# Altium footprint library con-molex.PCBLIB: 368 footprints (part 11 of 26) (continued)
## 52760-1679 [mm] (continued)
  round 0.7 hole 0.7: 1(26.735,0)
  rect 2.5x2 smd: M1(-28.775,0) M2(28.775,0)
Top Overlay:
  lines w0.203: -28.65,-1.5 -29.25,-1.5 -29.25,-1.9 -28.05,-3.1 -27.25,-3.1 -27.25,-2.4 ; -28.65,1.5 -29.25,1.5 -29.25,3.1 -27.25,3.1 -27.25,2.4 ; -25.65,-2 -27.4,-2 -27.4,0 -26.65,0 -26.65,2 -25.65,2 ; -25.65,-1 cw(c-25.65,-0.75) -25.9,-0.75 -25.9,0.75 cw(c-25.65,0.75) -25.65,1 ; 25.65,-2 27.4,-2 27.4,0 26.65,0 26.65,2 25.65,2 ; 25.65,-1 ccw(c25.65,-0.75) 25.9,-0.75 25.9,0.75 ccw(c25.65,0.75) 25.65,1 ; 27.25,-2.4 27.25,-3.1 29.25,-3.1 29.25,-1.5 28.65,-1.5 ; 27.25,2.4 27.25,3.1 29.25,3.1 29.25,1.5 28.65,1.5
Top Solder:
  drawing of 160 lines, arcs and shapes, not listed
Mechanical 16:
  drawing of 168 lines, arcs and shapes, not listed

## 52760-1879 [mm]
pads (184):
  round 0.9 hole 0.9: 1(-29.91,0)
  rect 0.35x2.5 smd: 1(-28.258,-2.35) 2(-28.258,2.35) 3(-27.622,-2.35) 4(-27.622,2.35) 5(-26.987,-2.35) 6(-26.987,2.35) 7(-26.352,-2.35) 8(-26.352,2.35) 9(-25.717,-2.35) 10(-25.717,2.35) 11(-25.082,-2.35) 12(-25.082,2.35) 13(-24.447,-2.35) 14(-24.447,2.35) 15(-23.812,-2.35) 16(-23.812,2.35) 17(-23.177,-2.35) 18(-23.177,2.35) 19(-22.543,-2.35) 20(-22.543,2.35) 21(-21.907,-2.35) 22(-21.907,2.35) 23(-21.273,-2.35) 24(-21.273,2.35) 25(-20.637,-2.35) 26(-20.637,2.35) 27(-20.002,-2.35) 28(-20.002,2.35) 29(-19.367,-2.35) 30(-19.367,2.35) 31(-18.732,-2.35) 32(-18.732,2.35) 33(-18.098,-2.35) 34(-18.098,2.35) 35(-17.462,-2.35) 36(-17.462,2.35) 37(-16.828,-2.35) 38(-16.828,2.35) 39(-16.192,-2.35) 40(-16.192,2.35) 41(-15.557,-2.35) 42(-15.557,2.35) 43(-14.922,-2.35) 44(-14.922,2.35) 45(-14.287,-2.35) 46(-14.287,2.35) 47(-13.652,-2.35) 48(-13.652,2.35) 49(-13.018,-2.35) 50(-13.018,2.35) 51(-12.383,-2.35) 52(-12.383,2.35) 53(-11.747,-2.35) 54(-11.747,2.35) 55(-11.112,-2.35) 56(-11.112,2.35) 57(-10.477,-2.35) 58(-10.477,2.35) 59(-9.842,-2.35) 60(-9.842,2.35) 61(-9.207,-2.35) 62(-9.207,2.35) 63(-8.572,-2.35) 64(-8.572,2.35) 65(-7.938,-2.35) 66(-7.938,2.35) 67(-7.302,-2.35) 68(-7.302,2.35) 69(-6.667,-2.35) 70(-6.667,2.35) 71(-6.032,-2.35) 72(-6.032,2.35) 73(-5.397,-2.35) 74(-5.397,2.35) 75(-4.763,-2.35) 76(-4.763,2.35) 77(-4.127,-2.35) 78(-4.127,2.35) 79(-3.492,-2.35) 80(-3.492,2.35) 81(-2.857,-2.35) 82(-2.857,2.35) 83(-2.222,-2.35) 84(-2.222,2.35) 85(-1.587,-2.35) 86(-1.587,2.35) 87(-0.953,-2.35) 88(-0.953,2.35) 89(-0.318,-2.35) 90(-0.318,2.35) 91(0.318,-2.35) 92(0.318,2.35) 93(0.953,-2.35) 94(0.953,2.35) 95(1.587,-2.35) 96(1.587,2.35) 97(2.222,-2.35) 98(2.222,2.35) 99(2.857,-2.35) 100(2.857,2.35) 101(3.492,-2.35) 102(3.492,2.35) 103(4.127,-2.35) 104(4.127,2.35) 105(4.763,-2.35) 106(4.763,2.35) 107(5.397,-2.35) 108(5.397,2.35) 109(6.032,-2.35) 110(6.032,2.35) 111(6.667,-2.35) 112(6.667,2.35) 113(7.302,-2.35) 114(7.302,2.35) 115(7.938,-2.35) 116(7.938,2.35) 117(8.572,-2.35) 118(8.572,2.35) 119(9.207,-2.35) 120(9.207,2.35) 121(9.842,-2.35) 122(9.842,2.35) 123(10.477,-2.35) 124(10.477,2.35) 125(11.112,-2.35) 126(11.112,2.35) 127(11.747,-2.35) 128(11.747,2.35) 129(12.383,-2.35) 130(12.383,2.35) 131(13.018,-2.35) 132(13.018,2.35) 133(13.652,-2.35) 134(13.652,2.35) 135(14.287,-2.35) 136(14.287,2.35) 137(14.922,-2.35) 138(14.922,2.35) 139(15.557,-2.35) 140(15.557,2.35) 141(16.192,-2.35) 142(16.192,2.35) 143(16.828,-2.35) 144(16.828,2.35) 145(17.462,-2.35) 146(17.462,2.35) 147(18.098,-2.35) 148(18.098,2.35) 149(18.732,-2.35) 150(18.732,2.35) 151(19.367,-2.35) 152(19.367,2.35) 153(20.002,-2.35) 154(20.002,2.35) 155(20.637,-2.35) 156(20.637,2.35) 157(21.273,-2.35) 158(21.273,2.35) 159(21.907,-2.35) 160(21.907,2.35) 161(22.543,-2.35) 162(22.543,2.35) 163(23.177,-2.35) 164(23.177,2.35) 165(23.812,-2.35) 166(23.812,2.35) 167(24.447,-2.35) 168(24.447,2.35) 169(25.082,-2.35) 170(25.082,2.35) 171(25.717,-2.35) 172(25.717,2.35) 173(26.352,-2.35) 174(26.352,2.35) 175(26.987,-2.35) 176(26.987,2.35) 177(27.622,-2.35) 178(27.622,2.35) 179(28.258,-2.35) 180(28.258,2.35)
  round 0.7 hole 0.7: 1(29.91,0)
  rect 2.5x2 smd: M1(-31.95,0) M2(31.95,0)
Top Overlay:
  lines w0.203: -31.825,-1.5 -32.425,-1.5 -32.425,-1.9 -31.225,-3.1 -30.425,-3.1 -30.425,-2.4 ; -31.825,1.5 -32.425,1.5 -32.425,3.1 -30.425,3.1 -30.425,2.4 ; -28.825,-2 -30.575,-2 -30.575,0 -29.825,0 -29.825,2 -28.825,2 ; -28.825,-1 cw(c-28.825,-0.75) -29.075,-0.75 -29.075,0.75 cw(c-28.825,0.75) -28.825,1 ; 28.825,-2 30.575,-2 30.575,0 29.825,0 29.825,2 28.825,2 ; 28.825,-1 ccw(c28.825,-0.75) 29.075,-0.75 29.075,0.75 ccw(c28.825,0.75) 28.825,1 ; 30.425,-2.4 30.425,-3.1 32.425,-3.1 32.425,-1.5 31.825,-1.5 ; 30.425,2.4 30.425,3.1 32.425,3.1 32.425,1.5 31.825,1.5
Top Solder:
  drawing of 180 lines, arcs and shapes, not listed
Mechanical 16:
  drawing of 188 lines, arcs and shapes, not listed

## 52760-2079 [mm]
pads (204):
  round 0.9 hole 0.9: 1(-33.085,0)
  rect 0.35x2.5 smd: 1(-31.432,-2.35) 2(-31.432,2.35) 3(-30.797,-2.35) 4(-30.797,2.35) 5(-30.162,-2.35) 6(-30.162,2.35) 7(-29.527,-2.35) 8(-29.527,2.35) 9(-28.892,-2.35) 10(-28.892,2.35) 11(-28.258,-2.35) 12(-28.258,2.35) 13(-27.622,-2.35) 14(-27.622,2.35) 15(-26.987,-2.35) 16(-26.987,2.35) 17(-26.352,-2.35) 18(-26.352,2.35) 19(-25.717,-2.35) 20(-25.717,2.35) 21(-25.082,-2.35) 22(-25.082,2.35) 23(-24.447,-2.35) 24(-24.447,2.35) 25(-23.812,-2.35) 26(-23.812,2.35) 27(-23.177,-2.35) 28(-23.177,2.35) 29(-22.543,-2.35) 30(-22.543,2.35) 31(-21.907,-2.35) 32(-21.907,2.35) 33(-21.273,-2.35) 34(-21.273,2.35) 35(-20.637,-2.35) 36(-20.637,2.35) 37(-20.002,-2.35) 38(-20.002,2.35) 39(-19.367,-2.35) 40(-19.367,2.35) 41(-18.732,-2.35) 42(-18.732,2.35) 43(-18.098,-2.35) 44(-18.098,2.35) 45(-17.462,-2.35) 46(-17.462,2.35) 47(-16.828,-2.35) 48(-16.828,2.35) 49(-16.192,-2.35) 50(-16.192,2.35) 51(-15.557,-2.35) 52(-15.557,2.35) 53(-14.922,-2.35) 54(-14.922,2.35) 55(-14.287,-2.35) 56(-14.287,2.35) 57(-13.652,-2.35) 58(-13.652,2.35) 59(-13.018,-2.35) 60(-13.018,2.35) 61(-12.383,-2.35) 62(-12.383,2.35) 63(-11.747,-2.35) 64(-11.747,2.35) 65(-11.112,-2.35) 66(-11.112,2.35) 67(-10.477,-2.35) 68(-10.477,2.35) 69(-9.842,-2.35) 70(-9.842,2.35) 71(-9.207,-2.35) 72(-9.207,2.35) 73(-8.572,-2.35) 74(-8.572,2.35) 75(-7.938,-2.35) 76(-7.938,2.35) 77(-7.302,-2.35) 78(-7.302,2.35) 79(-6.667,-2.35) 80(-6.667,2.35) 81(-6.032,-2.35) 82(-6.032,2.35) 83(-5.397,-2.35) 84(-5.397,2.35) 85(-4.763,-2.35) 86(-4.763,2.35) 87(-4.127,-2.35) 88(-4.127,2.35) 89(-3.492,-2.35) 90(-3.492,2.35) 91(-2.857,-2.35) 92(-2.857,2.35) 93(-2.222,-2.35) 94(-2.222,2.35) 95(-1.587,-2.35) 96(-1.587,2.35) 97(-0.953,-2.35) 98(-0.953,2.35) 99(-0.318,-2.35) 100(-0.318,2.35) 101(0.318,-2.35) 102(0.318,2.35) 103(0.953,-2.35) 104(0.953,2.35) 105(1.587,-2.35) 106(1.587,2.35) 107(2.222,-2.35) 108(2.222,2.35) 109(2.857,-2.35) 110(2.857,2.35) 111(3.492,-2.35) 112(3.492,2.35) 113(4.127,-2.35) 114(4.127,2.35) 115(4.763,-2.35) 116(4.763,2.35) 117(5.397,-2.35) 118(5.397,2.35) 119(6.032,-2.35) 120(6.032,2.35) 121(6.667,-2.35) 122(6.667,2.35) 123(7.302,-2.35) 124(7.302,2.35) 125(7.938,-2.35) 126(7.938,2.35) 127(8.572,-2.35) 128(8.572,2.35) 129(9.207,-2.35) 130(9.207,2.35) 131(9.842,-2.35) 132(9.842,2.35) 133(10.477,-2.35) 134(10.477,2.35) 135(11.112,-2.35) 136(11.112,2.35) 137(11.747,-2.35) 138(11.747,2.35) 139(12.383,-2.35) 140(12.383,2.35) 141(13.018,-2.35) 142(13.018,2.35) 143(13.652,-2.35) 144(13.652,2.35) 145(14.287,-2.35) 146(14.287,2.35) 147(14.922,-2.35) 148(14.922,2.35) 149(15.557,-2.35) 150(15.557,2.35) 151(16.192,-2.35) 152(16.192,2.35) 153(16.828,-2.35) 154(16.828,2.35) 155(17.462,-2.35) 156(17.462,2.35) 157(18.098,-2.35) 158(18.098,2.35) 159(18.732,-2.35) 160(18.732,2.35) 161(19.367,-2.35) 162(19.367,2.35) 163(20.002,-2.35) 164(20.002,2.35) 165(20.637,-2.35) 166(20.637,2.35) 167(21.273,-2.35) 168(21.273,2.35) 169(21.907,-2.35) 170(21.907,2.35) 171(22.543,-2.35) 172(22.543,2.35) 173(23.177,-2.35) 174(23.177,2.35) 175(23.812,-2.35) 176(23.812,2.35) 177(24.447,-2.35) 178(24.447,2.35) 179(25.082,-2.35) 180(25.082,2.35) 181(25.717,-2.35) 182(25.717,2.35) 183(26.352,-2.35) 184(26.352,2.35) 185(26.987,-2.35) 186(26.987,2.35) 187(27.622,-2.35) 188(27.622,2.35) 189(28.258,-2.35) 190(28.258,2.35) 191(28.892,-2.35) 192(28.892,2.35) 193(29.527,-2.35) 194(29.527,2.35) 195(30.162,-2.35) 196(30.162,2.35) 197(30.797,-2.35) 198(30.797,2.35) 199(31.432,-2.35) 200(31.432,2.35)
  round 0.7 hole 0.7: 1(33.085,0)
  rect 2.5x2 smd: M1(-35.125,0) M2(35.125,0)
Top Overlay:
  lines w0.203: -35,-1.5 -35.6,-1.5 -35.6,-1.9 -34.4,-3.1 -33.6,-3.1 -33.6,-2.4 ; -35,1.5 -35.6,1.5 -35.6,3.1 -33.6,3.1 -33.6,2.4 ; -32,-2 -33.75,-2 -33.75,0 -33,0 -33,2 -32,2 ; -32,-1 cw(c-32,-0.75) -32.25,-0.75 -32.25,0.75 cw(c-32,0.75) -32,1 ; 32,-2 33.75,-2 33.75,0 33,0 33,2 32,2 ; 32,-1 ccw(c32,-0.75) 32.25,-0.75 32.25,0.75 ccw(c32,0.75) 32,1 ; 33.6,-2.4 33.6,-3.1 35.6,-3.1 35.6,-1.5 35,-1.5 ; 33.6,2.4 33.6,3.1 35.6,3.1 35.6,1.5 35,1.5
Top Solder:
  drawing of 200 lines, arcs and shapes, not listed
Mechanical 16:
  drawing of 208 lines, arcs and shapes, not listed

## 52760-6879 [mm]
pads (72):
  round 0.9 hole 0.9: 1(-12.13,0)
  rect 0.35x2.5 smd: 1(-10.477,-2.35) 2(-10.477,2.35) 3(-9.842,-2.35) 4(-9.842,2.35) 5(-9.207,-2.35) 6(-9.207,2.35) 7(-8.572,-2.35) 8(-8.572,2.35) 9(-7.938,-2.35) 10(-7.938,2.35) 11(-7.302,-2.35) 12(-7.302,2.35) 13(-6.667,-2.35) 14(-6.667,2.35) 15(-6.032,-2.35) 16(-6.032,2.35) 17(-5.397,-2.35) 18(-5.397,2.35) 19(-4.763,-2.35) 20(-4.763,2.35) 21(-4.127,-2.35) 22(-4.127,2.35) 23(-3.492,-2.35) 24(-3.492,2.35) 25(-2.857,-2.35) 26(-2.857,2.35) 27(-2.222,-2.35) 28(-2.222,2.35) 29(-1.587,-2.35) 30(-1.587,2.35) 31(-0.953,-2.35) 32(-0.953,2.35) 33(-0.318,-2.35) 34(-0.318,2.35) 35(0.318,-2.35) 36(0.318,2.35) 37(0.953,-2.35) 38(0.953,2.35) 39(1.587,-2.35) 40(1.587,2.35) 41(2.222,-2.35) 42(2.222,2.35) 43(2.857,-2.35) 44(2.857,2.35) 45(3.492,-2.35) 46(3.492,2.35) 47(4.127,-2.35) 48(4.127,2.35) 49(4.763,-2.35) 50(4.763,2.35) 51(5.397,-2.35) 52(5.397,2.35) 53(6.032,-2.35) 54(6.032,2.35) 55(6.667,-2.35) 56(6.667,2.35) 57(7.302,-2.35) 58(7.302,2.35) 59(7.938,-2.35) 60(7.938,2.35) 61(8.572,-2.35) 62(8.572,2.35) 63(9.207,-2.35) 64(9.207,2.35) 65(9.842,-2.35) 66(9.842,2.35) 67(10.477,-2.35) 68(10.477,2.35)
  round 0.7 hole 0.7: 1(12.13,0)
  rect 2.5x2 smd: M1(-14.17,0) M2(14.17,0)
Top Overlay:
  lines w0.203: -14.045,-1.5 -14.645,-1.5 -14.645,-1.9 -13.445,-3.1 -12.645,-3.1 -12.645,-2.4 ; -14.045,1.5 -14.645,1.5 -14.645,3.1 -12.645,3.1 -12.645,2.4 ; -11.045,-2 -12.795,-2 -12.795,0 -12.045,0 -12.045,2 -11.045,2 ; -11.045,-1 cw(c-11.045,-0.75) -11.295,-0.75 -11.295,0.75 cw(c-11.045,0.75) -11.045,1 ; 11.045,-2 12.795,-2 12.795,0 12.045,0 12.045,2 11.045,2 ; 11.045,-1 ccw(c11.045,-0.75) 11.295,-0.75 11.295,0.75 ccw(c11.045,0.75) 11.045,1 ; 12.645,-2.4 12.645,-3.1 14.645,-3.1 14.645,-1.5 14.045,-1.5 ; 12.645,2.4 12.645,3.1 14.645,3.1 14.645,1.5 14.045,1.5
Top Solder:
  rectangle: -10.677,-3.625 -10.278,-1.075
  region: -10.278,3.625 -10.677,3.625 -10.677,1.075 -10.278,1.075
  rectangle: -10.042,-3.625 -9.643,-1.075
  region: -9.643,3.625 -10.042,3.625 -10.042,1.075 -9.643,1.075
  rectangle: -9.407,-3.625 -9.008,-1.075
  region: -9.008,3.625 -9.407,3.625 -9.407,1.075 -9.008,1.075
  rectangle: -8.772,-3.625 -8.373,-1.075
  region: -8.373,3.625 -8.772,3.625 -8.772,1.075 -8.373,1.075
  rectangle: -8.137,-3.625 -7.738,-1.075
  region: -7.738,3.625 -8.137,3.625 -8.137,1.075 -7.738,1.075
  rectangle: -7.502,-3.625 -7.103,-1.075
  region: -7.103,3.625 -7.502,3.625 -7.502,1.075 -7.103,1.075
  rectangle: -6.867,-3.625 -6.468,-1.075
  region: -6.468,3.625 -6.867,3.625 -6.867,1.075 -6.468,1.075
  rectangle: -6.232,-3.625 -5.833,-1.075
  region: -5.833,3.625 -6.232,3.625 -6.232,1.075 -5.833,1.075
  rectangle: -5.597,-3.625 -5.198,-1.075
  region: -5.198,3.625 -5.597,3.625 -5.597,1.075 -5.198,1.075
  rectangle: -4.962,-3.625 -4.563,-1.075
  region: -4.563,3.625 -4.962,3.625 -4.962,1.075 -4.563,1.075
  rectangle: -4.327,-3.625 -3.928,-1.075
  region: -3.928,3.625 -4.327,3.625 -4.327,1.075 -3.928,1.075
  rectangle: -3.692,-3.625 -3.293,-1.075
  region: -3.293,3.625 -3.692,3.625 -3.692,1.075 -3.293,1.075
  rectangle: -3.057,-3.625 -2.658,-1.075
  region: -2.658,3.625 -3.057,3.625 -3.057,1.075 -2.658,1.075
  rectangle: -2.422,-3.625 -2.023,-1.075
  region: -2.023,3.625 -2.422,3.625 -2.422,1.075 -2.023,1.075
  rectangle: -1.787,-3.625 -1.388,-1.075
  region: -1.388,3.625 -1.787,3.625 -1.787,1.075 -1.388,1.075
  rectangle: -1.152,-3.625 -0.753,-1.075
  region: -0.753,3.625 -1.152,3.625 -1.152,1.075 -0.753,1.075
  rectangle: -0.517,-3.625 -0.118,-1.075
  region: -0.118,3.625 -0.517,3.625 -0.517,1.075 -0.118,1.075
  rectangle: 0.118,-3.625 0.517,-1.075
  region: 0.517,3.625 0.118,3.625 0.118,1.075 0.517,1.075
  rectangle: 0.753,-3.625 1.152,-1.075
  region: 1.152,3.625 0.753,3.625 0.753,1.075 1.152,1.075
  rectangle: 1.388,-3.625 1.787,-1.075
  region: 1.787,3.625 1.388,3.625 1.388,1.075 1.787,1.075
  rectangle: 2.023,-3.625 2.422,-1.075
  region: 2.422,3.625 2.023,3.625 2.023,1.075 2.422,1.075
  rectangle: 2.658,-3.625 3.057,-1.075
  region: 3.057,3.625 2.658,3.625 2.658,1.075 3.057,1.075
  rectangle: 3.293,-3.625 3.692,-1.075
  region: 3.692,3.625 3.293,3.625 3.293,1.075 3.692,1.075
  rectangle: 3.928,-3.625 4.327,-1.075
  region: 4.327,3.625 3.928,3.625 3.928,1.075 4.327,1.075
  rectangle: 4.563,-3.625 4.962,-1.075
  region: 4.962,3.625 4.563,3.625 4.563,1.075 4.962,1.075
  rectangle: 5.198,-3.625 5.597,-1.075
  region: 5.597,3.625 5.198,3.625 5.198,1.075 5.597,1.075
  rectangle: 5.833,-3.625 6.232,-1.075
  region: 6.232,3.625 5.833,3.625 5.833,1.075 6.232,1.075
  rectangle: 6.468,-3.625 6.867,-1.075
  region: 6.867,3.625 6.468,3.625 6.468,1.075 6.867,1.075
  rectangle: 7.103,-3.625 7.502,-1.075
  region: 7.502,3.625 7.103,3.625 7.103,1.075 7.502,1.075
  rectangle: 7.738,-3.625 8.137,-1.075
  region: 8.137,3.625 7.738,3.625 7.738,1.075 8.137,1.075
  rectangle: 8.373,-3.625 8.772,-1.075
  region: 8.772,3.625 8.373,3.625 8.373,1.075 8.772,1.075
  rectangle: 9.008,-3.625 9.407,-1.075
  region: 9.407,3.625 9.008,3.625 9.008,1.075 9.407,1.075
  rectangle: 9.643,-3.625 10.042,-1.075
  region: 10.042,3.625 9.643,3.625 9.643,1.075 10.042,1.075
  rectangle: 10.278,-3.625 10.677,-1.075
  region: 10.677,3.625 10.278,3.625 10.278,1.075 10.677,1.075
Mechanical 16:
  rectangle: -10.628,-3.1 -10.327,-2.375
  region: -10.327,3.1 -10.628,3.1 -10.628,2.375 -10.327,2.375
  rectangle: -9.993,-3.1 -9.692,-2.375
  region: -9.692,3.1 -9.993,3.1 -9.993,2.375 -9.692,2.375
  rectangle: -9.358,-3.1 -9.057,-2.375
  region: -9.057,3.1 -9.358,3.1 -9.358,2.375 -9.057,2.375
  rectangle: -8.723,-3.1 -8.422,-2.375
  region: -8.422,3.1 -8.723,3.1 -8.723,2.375 -8.422,2.375
  rectangle: -8.088,-3.1 -7.787,-2.375
  region: -7.787,3.1 -8.088,3.1 -8.088,2.375 -7.787,2.375
  rectangle: -7.453,-3.1 -7.152,-2.375
  region: -7.152,3.1 -7.453,3.1 -7.453,2.375 -7.152,2.375
  rectangle: -6.818,-3.1 -6.517,-2.375
  region: -6.517,3.1 -6.818,3.1 -6.818,2.375 -6.517,2.375
  rectangle: -6.183,-3.1 -5.882,-2.375
  region: -5.882,3.1 -6.183,3.1 -6.183,2.375 -5.882,2.375
  rectangle: -5.548,-3.1 -5.247,-2.375
  region: -5.247,3.1 -5.548,3.1 -5.548,2.375 -5.247,2.375
  rectangle: -4.913,-3.1 -4.612,-2.375
  region: -4.612,3.1 -4.913,3.1 -4.913,2.375 -4.612,2.375
  rectangle: -4.278,-3.1 -3.977,-2.375
  region: -3.977,3.1 -4.278,3.1 -4.278,2.375 -3.977,2.375
  rectangle: -3.643,-3.1 -3.342,-2.375
  region: -3.342,3.1 -3.643,3.1 -3.643,2.375 -3.342,2.375
  rectangle: -3.008,-3.1 -2.707,-2.375
  region: -2.707,3.1 -3.008,3.1 -3.008,2.375 -2.707,2.375
  rectangle: -2.373,-3.1 -2.072,-2.375
  region: -2.072,3.1 -2.373,3.1 -2.373,2.375 -2.072,2.375
  rectangle: -1.738,-3.1 -1.437,-2.375
  region: -1.437,3.1 -1.738,3.1 -1.738,2.375 -1.437,2.375
  rectangle: -1.103,-3.1 -0.802,-2.375
  region: -0.802,3.1 -1.103,3.1 -1.103,2.375 -0.802,2.375
  rectangle: -0.468,-3.1 -0.167,-2.375
  region: -0.167,3.1 -0.468,3.1 -0.468,2.375 -0.167,2.375
  rectangle: 0.167,-3.1 0.468,-2.375
  region: 0.468,3.1 0.167,3.1 0.167,2.375 0.468,2.375
  rectangle: 0.802,-3.1 1.103,-2.375
  region: 1.103,3.1 0.802,3.1 0.802,2.375 1.103,2.375
  rectangle: 1.437,-3.1 1.738,-2.375
  region: 1.738,3.1 1.437,3.1 1.437,2.375 1.738,2.375
  rectangle: 2.072,-3.1 2.373,-2.375
  region: 2.373,3.1 2.072,3.1 2.072,2.375 2.373,2.375
  rectangle: 2.707,-3.1 3.008,-2.375
  region: 3.008,3.1 2.707,3.1 2.707,2.375 3.008,2.375
  rectangle: 3.342,-3.1 3.643,-2.375
  region: 3.643,3.1 3.342,3.1 3.342,2.375 3.643,2.375
  rectangle: 3.977,-3.1 4.278,-2.375
  region: 4.278,3.1 3.977,3.1 3.977,2.375 4.278,2.375
  rectangle: 4.612,-3.1 4.913,-2.375
  region: 4.913,3.1 4.612,3.1 4.612,2.375 4.913,2.375
  rectangle: 5.247,-3.1 5.548,-2.375
  region: 5.548,3.1 5.247,3.1 5.247,2.375 5.548,2.375
  rectangle: 5.882,-3.1 6.183,-2.375
  region: 6.183,3.1 5.882,3.1 5.882,2.375 6.183,2.375
  rectangle: 6.517,-3.1 6.818,-2.375
  region: 6.818,3.1 6.517,3.1 6.517,2.375 6.818,2.375
  rectangle: 7.152,-3.1 7.453,-2.375
  region: 7.453,3.1 7.152,3.1 7.152,2.375 7.453,2.375
  rectangle: 7.787,-3.1 8.088,-2.375
  region: 8.088,3.1 7.787,3.1 7.787,2.375 8.088,2.375
  rectangle: 8.422,-3.1 8.723,-2.375
  region: 8.723,3.1 8.422,3.1 8.422,2.375 8.723,2.375
  rectangle: 9.057,-3.1 9.358,-2.375
  region: 9.358,3.1 9.057,3.1 9.057,2.375 9.358,2.375
  rectangle: 9.692,-3.1 9.993,-2.375
  region: 9.993,3.1 9.692,3.1 9.692,2.375 9.993,2.375
  rectangle: 10.327,-3.1 10.628,-2.375
  region: 10.628,3.1 10.327,3.1 10.327,2.375 10.628,2.375
  lines w0.203: -14.045,-1.5 -14.045,1.5 ; -12.645,-2.4 12.645,-2.4 ; -12.645,2.4 12.645,2.4 ; -11.045,-2 11.045,-2 ; -11.045,-1 11.045,-1 ; -11.045,1 11.045,1 ; -11.045,2 11.045,2 ; 14.045,-1.5 14.045,1.5

## 53047-02 [mil]
pads (2):
  oval 27.5x55 hole 19.69: 1(24.61,17.72) 2(-24.61,17.72)
Top Overlay:
  rectangle: -78.74,-59.06 78.74,-44.29
  lines w2: -78.74,-9.84 -63.98,-9.84 -63.98,-49.21 ; -78.74,14.76 -63.98,14.76 -63.98,44.29 ; -73.82,54.13 -63.98,44.29 ; 63.98,-49.21 63.98,-9.84 78.74,-9.84 ; 73.82,54.13 63.98,44.29 ; 78.74,14.76 63.98,14.76 63.98,44.29 ; -63.98,44.29 63.98,44.29
  lines w8: -79.72,-59.06 79.72,-59.06 79.72,59.06 -79.72,59.06 -79.72,-59.06

## 53047-03 [mil]
pads (3):
  oval 27.5x55 hole 19.69: 1(49.21,17.72) 2(0,17.72) 3(-49.21,17.72)
Top Overlay:
  rectangle: -103.35,-59.06 103.35,-44.29
  lines w2: -103.35,-9.84 -88.58,-9.84 -88.58,-49.21 ; -103.35,14.76 -88.58,14.76 -88.58,44.29 ; -98.43,54.13 -88.58,44.29 ; 88.58,-49.21 88.58,-9.84 103.35,-9.84 ; 98.43,54.13 88.58,44.29 ; 103.35,14.76 88.58,14.76 88.58,44.29 ; -88.58,44.29 88.58,44.29
  lines w8: -104.33,-59.06 104.33,-59.06 104.33,59.06 -104.33,59.06 -104.33,-59.06

## 53047-04 [mil]
pads (4):
  oval 27.5x55 hole 19.69: 1(73.82,17.72) 2(24.61,17.72) 3(-24.61,17.72) 4(-73.82,17.72)
Top Overlay:
  rectangle: -127.95,-59.06 127.95,-44.29
  lines w2: -127.95,-9.84 -113.19,-9.84 -113.19,-49.21 ; -127.95,14.76 -113.19,14.76 -113.19,44.29 ; -123.03,54.13 -113.19,44.29 ; 113.19,-49.21 113.19,-9.84 127.95,-9.84 ; 123.03,54.13 113.19,44.29 ; 127.95,14.76 113.19,14.76 113.19,44.29 ; -113.19,44.29 113.19,44.29
  lines w8: -128.94,-59.06 128.94,-59.06 128.94,59.06 -128.94,59.06 -128.94,-59.06

## 53047-05 [mil]
pads (5):
  oval 27.5x55 hole 19.69: 1(98.43,17.72) 2(49.21,17.72) 3(0,17.72) 4(-49.21,17.72) 5(-98.43,17.72)
Top Overlay:
  rectangle: -152.56,-59.06 152.56,-44.29
  lines w2: -152.56,-9.84 -137.8,-9.84 -137.8,-49.21 ; -152.56,14.76 -137.8,14.76 -137.8,44.29 ; -147.64,54.13 -137.8,44.29 ; 137.8,-49.21 137.8,-9.84 152.56,-9.84 ; 147.64,54.13 137.8,44.29 ; 152.56,14.76 137.8,14.76 137.8,44.29 ; -137.8,44.29 137.8,44.29
  lines w8: -153.54,-59.06 153.54,-59.06 153.54,59.06 -153.54,59.06 -153.54,-59.06

## 53047-06 [mil]
pads (6):
  oval 27.5x55 hole 19.69: 1(123.03,17.72) 2(73.82,17.72) 3(24.61,17.72) 4(-24.61,17.72) 5(-73.82,17.72) 6(-123.03,17.72)
Top Overlay:
  rectangle: -177.17,-59.06 177.17,-44.29
  lines w2: -177.17,-9.84 -162.4,-9.84 -162.4,-49.21 ; -177.17,14.76 -162.4,14.76 -162.4,44.29 ; -172.24,54.13 -162.4,44.29 ; 162.4,-49.21 162.4,-9.84 177.17,-9.84 ; 172.24,54.13 162.4,44.29 ; 177.17,14.76 162.4,14.76 162.4,44.29 ; -162.4,44.29 162.4,44.29
  lines w8: -178.15,-59.06 178.15,-59.06 178.15,59.06 -178.15,59.06 -178.15,-59.06

## 53047-07 [mil]
pads (7):
  oval 27.5x55 hole 19.69: 1(147.64,17.72) 2(98.43,17.72) 3(49.21,17.72) 4(0,17.72) 5(-49.21,17.72) 6(-98.43,17.72) 7(-147.64,17.72)
Top Overlay:
  rectangle: -201.77,-59.06 201.77,-44.29
  lines w2: -201.77,-9.84 -187.01,-9.84 -187.01,-49.21 ; -201.77,14.76 -187.01,14.76 -187.01,44.29 ; -196.85,54.13 -187.01,44.29 ; 187.01,-49.21 187.01,-9.84 201.77,-9.84 ; 196.85,54.13 187.01,44.29 ; 201.77,14.76 187.01,14.76 187.01,44.29 ; -187.01,44.29 187.01,44.29
  lines w8: -202.76,-59.06 202.76,-59.06 202.76,59.06 -202.76,59.06 -202.76,-59.06

## 53047-08 [mil]
pads (8):
  oval 27.5x55 hole 19.69: 1(172.24,17.72) 2(123.03,17.72) 3(73.82,17.72) 4(24.61,17.72) 5(-24.61,17.72) 6(-73.82,17.72) 7(-123.03,17.72) 8(-172.24,17.72)
Top Overlay:
  rectangle: -226.38,-59.06 226.38,-44.29
  lines w2: -226.38,-9.84 -211.61,-9.84 -211.61,-49.21 ; -226.38,14.76 -211.61,14.76 -211.61,44.29 ; -221.46,54.13 -211.61,44.29 ; 211.61,-49.21 211.61,-9.84 226.38,-9.84 ; 221.46,54.13 211.61,44.29 ; 226.38,14.76 211.61,14.76 211.61,44.29 ; -211.61,44.29 211.61,44.29
  lines w8: -227.36,-59.06 227.36,-59.06 227.36,59.06 -227.36,59.06 -227.36,-59.06

## 53047-09 [mil]
pads (9):
  oval 27.5x55 hole 19.69: 1(196.85,17.72) 2(147.64,17.72) 3(98.43,17.72) 4(49.21,17.72) 5(0,17.72) 6(-49.21,17.72) 7(-98.43,17.72) 8(-147.64,17.72) 9(-196.85,17.72)
Top Overlay:
  rectangle: -250.98,-59.06 250.98,-44.29
  lines w2: -250.98,-9.84 -236.22,-9.84 -236.22,-49.21 ; -250.98,14.76 -236.22,14.76 -236.22,44.29 ; -246.06,54.13 -236.22,44.29 ; 236.22,-49.21 236.22,-9.84 250.98,-9.84 ; 246.06,54.13 236.22,44.29 ; 250.98,14.76 236.22,14.76 236.22,44.29 ; -236.22,44.29 236.22,44.29
  lines w8: -251.97,-59.06 251.97,-59.06 251.97,59.06 -251.97,59.06 -251.97,-59.06

## 53047-10 [mil]
pads (10):
  oval 27.5x55 hole 19.69: 1(221.46,17.72) 2(172.24,17.72) 3(123.03,17.72) 4(73.82,17.72) 5(24.61,17.72) 6(-24.61,17.72) 7(-73.82,17.72) 8(-123.03,17.72) 9(-172.24,17.72) 10(-221.46,17.72)
Top Overlay:
  rectangle: -275.59,-59.06 275.59,-44.29
  lines w2: -275.59,-9.84 -260.83,-9.84 -260.83,-49.21 ; -275.59,14.76 -260.83,14.76 -260.83,44.29 ; -270.67,54.13 -260.83,44.29 ; 260.83,-49.21 260.83,-9.84 275.59,-9.84 ; 270.67,54.13 260.83,44.29 ; 275.59,14.76 260.83,14.76 260.83,44.29 ; -260.83,44.29 260.83,44.29
  lines w8: -276.57,-59.06 276.57,-59.06 276.57,59.06 -276.57,59.06 -276.57,-59.06

## 53047-11 [mil]
pads (11):
  oval 27.5x55 hole 19.69: 1(246.06,17.72) 2(196.85,17.72) 3(147.64,17.72) 4(98.43,17.72) 5(49.21,17.72) 6(0,17.72) 7(-49.21,17.72) 8(-98.43,17.72) 9(-147.64,17.72) 10(-196.85,17.72) 11(-246.06,17.72)
Top Overlay:
  rectangle: -300.2,-59.06 300.2,-44.29
  lines w2: -300.2,-9.84 -285.43,-9.84 -285.43,-49.21 ; -300.2,14.76 -285.43,14.76 -285.43,44.29 ; -295.28,54.13 -285.43,44.29 ; 285.43,-49.21 285.43,-9.84 300.2,-9.84 ; 295.28,54.13 285.43,44.29 ; 300.2,14.76 285.43,14.76 285.43,44.29 ; -285.43,44.29 285.43,44.29
  lines w8: -301.18,-59.06 301.18,-59.06 301.18,59.06 -301.18,59.06 -301.18,-59.06

## 53047-12 [mil]
pads (12):
  oval 27.5x55 hole 19.69: 1(270.67,17.72) 2(221.46,17.72) 3(172.24,17.72) 4(123.03,17.72) 5(73.82,17.72) 6(24.61,17.72) 7(-24.61,17.72) 8(-73.82,17.72) 9(-123.03,17.72) 10(-172.24,17.72) 11(-221.46,17.72) 12(-270.67,17.72)
Top Overlay:
  rectangle: -324.8,-59.06 324.8,-44.29
  lines w2: -324.8,-9.84 -310.04,-9.84 -310.04,-49.21 ; -324.8,14.76 -310.04,14.76 -310.04,44.29 ; -319.88,54.13 -310.04,44.29 ; 310.04,-49.21 310.04,-9.84 324.8,-9.84 ; 319.88,54.13 310.04,44.29 ; 324.8,14.76 310.04,14.76 310.04,44.29 ; -310.04,44.29 310.04,44.29
  lines w8: -325.79,-59.06 325.79,-59.06 325.79,59.06 -325.79,59.06 -325.79,-59.06